# Altium footprint library PCB_PASSIVE.PcbLib: 100 footprints (part 7 of 7)
Each footprint in its own frame and in the unit in brackets; x right, y up, seen from the top. Pads: shape width x height; smd on the part's side, far side on the other; paste and mask are expansions set on the pad; w line width, h text height; cw(c..) or ccw(c..) is an arc to the next point about the centre after c.
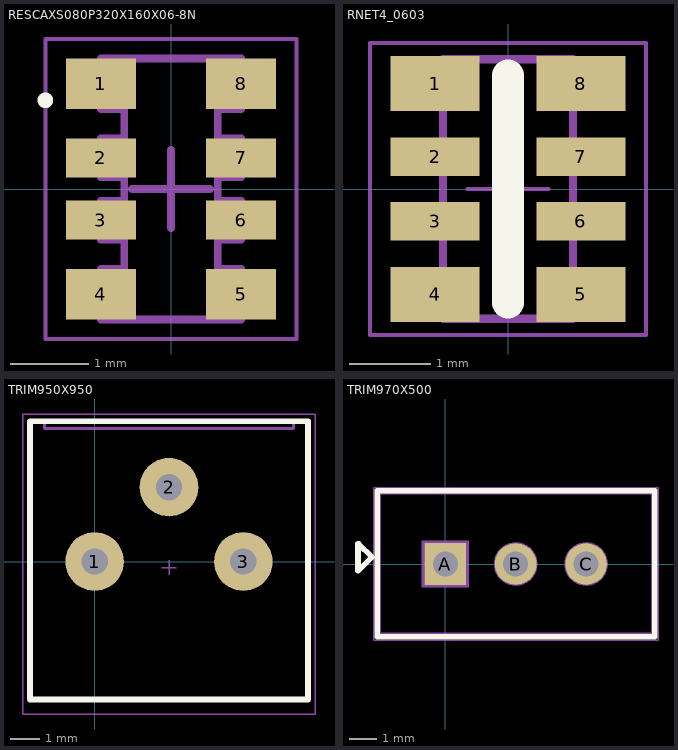
[diagram p6: the footprints below, top view; thin cyan lines are the x and y axes]

## RESCAXS080P320X160X06-8N [mm] "Chip Array, ConvexS, 8-Leads, Pitch 0,80mm,  Body 3,20x1,60mm,  IPC Medium Density"
height 1
pads (8):
  rect 0.9x0.65 smd: 1(-0.9,1.35) 4(-0.9,-1.35) 5(0.9,-1.35) 8(0.9,1.35)
  rect 0.9x0.5 smd: 2(-0.9,0.4) 3(-0.9,-0.4) 6(0.9,-0.4) 7(0.9,0.4)
Top Overlay:
  circle w0.1: c-1.612,1.138 r0.05
Mechanical 14:
  lines w0.1: -0.9,-1.675 -0.9,-1.025 -0.6,-1.025 -0.6,-0.65 -0.9,-0.65 -0.9,-0.15 -0.6,-0.15 -0.6,0.15 -0.9,0.15 -0.9,0.65 -0.6,0.65 -0.6,1.025 -0.9,1.025 -0.9,1.675 0.9,1.675 0.9,1.025 0.6,1.025 0.6,0.65 0.9,0.65 0.9,0.15 0.6,0.15 0.6,-0.15 0.9,-0.15 0.9,-0.65 0.6,-0.65 0.6,-1.025 0.9,-1.025 0.9,-1.675 -0.9,-1.675
Mechanical 15:
  lines w0.05: -1.61,-1.925 -1.61,1.925 1.61,1.925 1.61,-1.925 -1.61,-1.925
  lines w0.1: -0.5,0 0.5,0 ; 0,-0.5 0,0.5
3D body "SW3dPS-RN164P.STEP": height 0.55, standoff 0, extent -0.8,-1.6 0.8,1.6

## RNET4_0603 [mm]
pads (8):
  rect 1.1x0.675 smd: 1(-0.9,1.3) 4(-0.9,-1.3) 5(0.9,-1.3) 8(0.9,1.3)
  rect 1.1x0.475 smd: 2(-0.9,0.4) 3(-0.9,-0.4) 6(0.9,-0.4) 7(0.9,0.4)
Top Overlay:
  lines w0.4: 0,-1.4 0,1.4
Mechanical 11:
  text ".Designator" at -1.86,2.14 h0.76
Mechanical 14:
  lines w0.1: -0.8,-1.6 0.8,-1.6 0.8,1.6 -0.8,1.6 -0.8,-1.6
Mechanical 15:
  lines w0.05: -0.5,0 0.5,0 ; 0,-0.5 0,0.5 ; -1.7,-1.8 1.7,-1.8 1.7,1.8 -1.7,1.8 -1.7,-1.8
3D body "SW3dPS-RN164P.STEP": height 0.55, standoff 0, extent -0.8,-1.6 0.8,1.6

## TRIM950X950 [mm]
pads (3):
  round 2 hole 0.9: 1(0,0) 2(2.54,2.54) 3(5.08,0)
Top Overlay:
  lines w0.2: -2.21,-4.71 -2.21,4.79 7.29,4.79 7.29,-4.71 -2.21,-4.71
Mechanical 11:
  text ".Designator" at 0.1,5.4 h0.76
Mechanical 14:
  lines w0.1: -2.21,-4.71 7.29,-4.71 7.29,4.79 6.79,4.79 6.79,4.54 4.665,4.54 0.415,4.54 -1.71,4.54 -1.71,4.79 -2.21,4.79 -2.21,-4.71
Mechanical 15:
  lines w0.05: 2.29,-0.21 2.79,-0.21 ; 2.54,-0.46 2.54,0.04 ; -2.46,-5.21 -2.46,5.04 7.54,5.04 7.54,-5.21 -2.46,-5.21
3D body "SW3DPS-CERMET TRIMMER SINGLE TURN 10MM 500MW TOP ADJUST-DEFAULT.STEP": height 4.84, standoff -4.99, extent -2.225,-4.8 7.305,4.73

## TRIM970X500 [mm] "TRIMMER POTENTIOMETER"
height 9.5
pads (3):
  rect 1.5x1.5 hole 0.9: A(0,0)
  round 1.5 hole 0.9: B(2.54,0) C(5.08,0)
Top Overlay:
  lines w0.2: -3.15,-0.25 -3.15,0.725 -3.125,0.725 -2.65,0.25 -3.15,-0.25 ; -2.45,-2.625 -2.45,2.65 7.55,2.65 7.55,-2.625 -2.45,-2.625
Mechanical 11:
  text ".Designator" at -1.95,3.375 h1
Mechanical 14:
  circle w0.1: c2.54,0 r0.738
  circle w0.1: c5.08,0 r0.738
  lines w0.1: -2.375,-2.525 7.475,-2.525 7.475,2.55 -2.375,2.55 -2.375,-2.525 ; -0.8,-0.8 0.8,-0.8 0.8,0.8 -0.8,0.8 -0.8,-0.8
Mechanical 15:
  lines w0.05: -2.575,-2.75 7.675,-2.75 7.675,2.75 -2.575,2.75 -2.575,-2.75
3D body "User Library-3296W.step": height 11.55, standoff -1.6, extent -2.225,-2.4 7.305,2.4